# Altium footprint library PcbLib_ICs_part2.PcbLib: 66 footprints (part 5 of 5)
Each footprint in its own frame and in the unit in brackets; x right, y up, seen from the top. Pads: shape width x height; smd on the part's side, far side on the other; paste and mask are expansions set on the pad; w line width, h text height; cw(c..) or ccw(c..) is an arc to the next point about the centre after c.
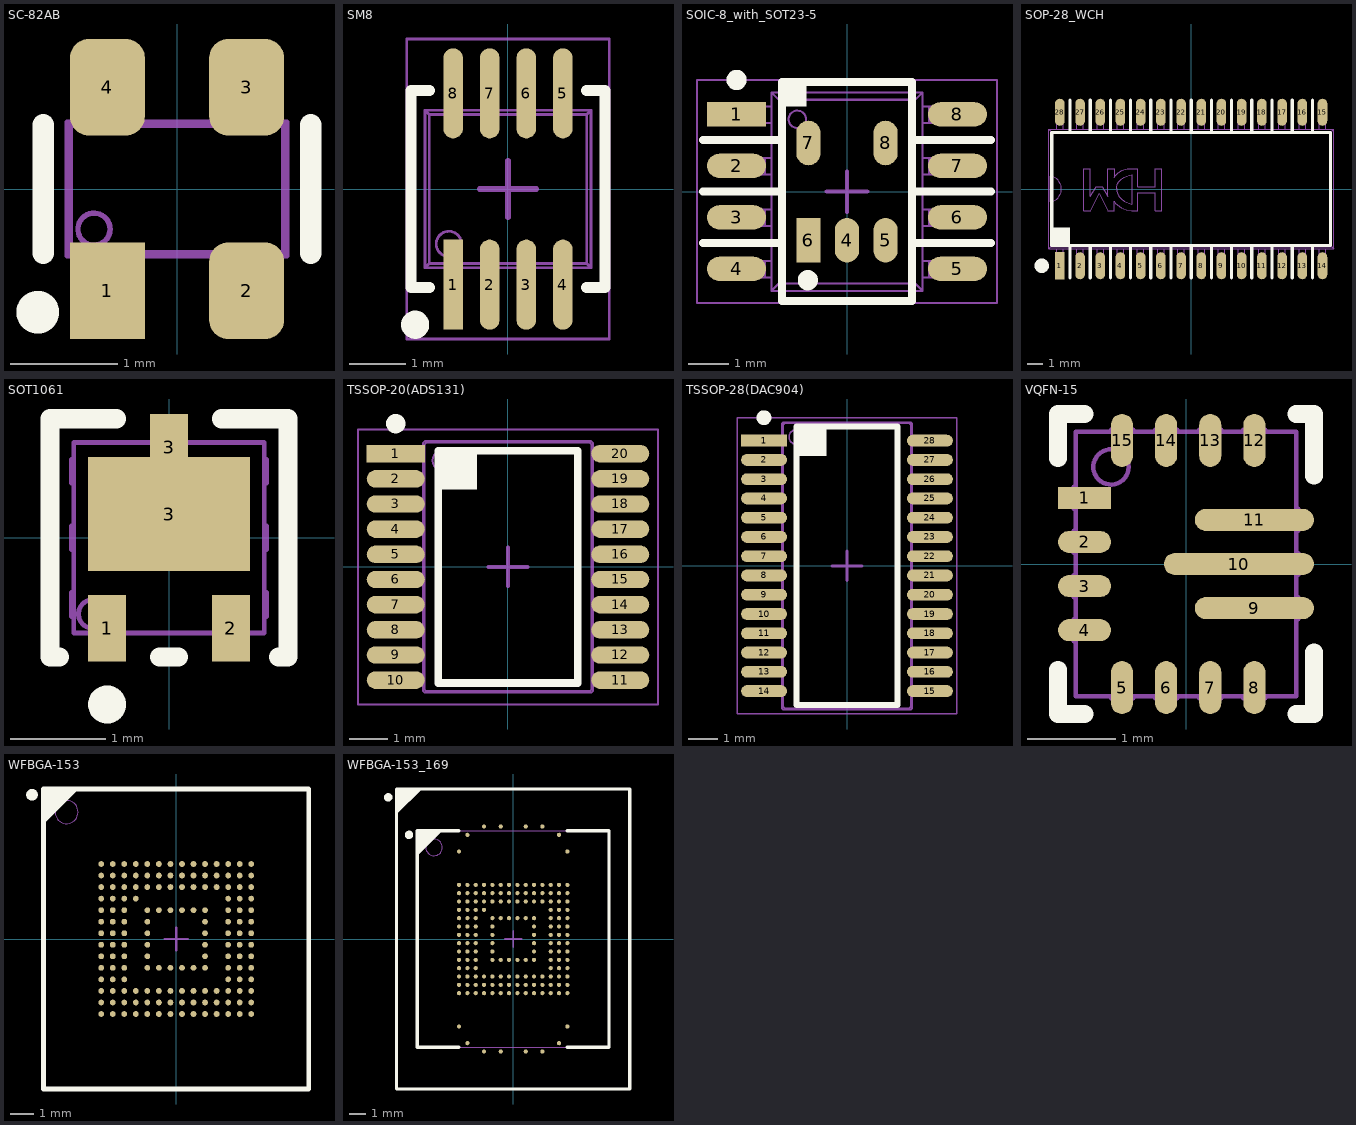
[diagram p4: the footprints below, top view; thin cyan lines are the x and y axes]

## SC-82AB [mm]
pads (4):
  rect 0.7x0.9 smd paste-0.025 mask+0.05: 1(-0.65,-0.95)
  rrect50% 0.7x0.9 smd paste-0.025 mask+0.05: 2(0.65,-0.95) 3(0.65,0.95) 4(-0.65,0.95)
Top Overlay:
  circle w0.2: c-1.3,-1.15 r0.1
  lines w0.2: -1.25,-0.6 -1.25,0.6 ; 1.25,-0.6 1.25,0.6
Top Assy:
  circle w0.05: c-0.775,-0.375 r0.15
  lines w0.05: -1.025,-0.625 -0.995,-0.595 ; -1.025,-0.625 -0.813,-0.625 ; -1.025,-0.625 -1.025,0.625 ; -1.025,0.625 -0.995,0.595 ; -1.025,0.625 -0.813,0.625 ; -0.995,-0.595 0.995,-0.595 ; -0.995,-0.595 -0.995,0.595 ; -0.995,0.595 0.995,0.595 ; -0.813,-0.961 -0.487,-0.961 ; -0.813,-0.961 -0.813,-0.893 ; -0.813,-0.961 -0.813,-1.055 -0.487,-1.055 -0.487,-0.961 ; -0.813,-0.893 -0.487,-0.893 ; -0.813,-0.893 -0.813,-0.834 ; -0.813,-0.834 -0.813,-0.686 ; -0.813,-0.834 -0.487,-0.834 ; -0.813,-0.686 -0.487,-0.686 ; -0.813,-0.686 -0.813,-0.625 ; -0.813,-0.625 -0.487,-0.625 ; -0.813,0.625 -0.813,0.686 ; -0.813,0.625 -0.487,0.625 ; -0.813,0.686 -0.813,0.834 ; -0.813,0.686 -0.487,0.686 ; -0.813,0.834 -0.487,0.834 ; -0.813,0.834 -0.813,0.893 ; -0.813,0.893 -0.487,0.893 ; -0.813,0.893 -0.813,0.961 ; -0.813,0.961 -0.487,0.961 ; -0.813,0.961 -0.813,1.055 -0.487,1.055 -0.487,0.961 ; -0.487,-0.961 -0.487,-0.893 ; -0.487,-0.893 -0.487,-0.834 ; -0.487,-0.834 -0.487,-0.686 ; -0.487,-0.686 -0.487,-0.625 ; -0.487,-0.625 0.487,-0.625 ; -0.487,0.625 -0.487,0.686 ; -0.487,0.625 0.487,0.625 ; -0.487,0.686 -0.487,0.834 ; -0.487,0.834 -0.487,0.893 ; -0.487,0.893 -0.487,0.961 ; 0.487,-0.961 0.813,-0.961 ; 0.487,-0.961 0.487,-0.893 ; 0.487,-0.961 0.487,-1.055 0.813,-1.055 0.813,-0.961 ; 0.487,-0.893 0.812,-0.893 ; 0.487,-0.893 0.487,-0.834 ; 0.487,-0.834 0.812,-0.834 ; 0.487,-0.834 0.487,-0.686 ; 0.487,-0.686 0.813,-0.686 ; 0.487,-0.686 0.487,-0.625 ; 0.487,-0.625 0.813,-0.625 ; 0.487,0.625 0.487,0.686 ; 0.487,0.625 0.813,0.625 ; 0.487,0.686 0.813,0.686 ; 0.487,0.686 0.487,0.834 ; 0.487,0.834 0.812,0.834 ; 0.487,0.834 0.487,0.893 ; 0.487,0.893 0.812,0.893 ; 0.487,0.893 0.487,0.961 ; 0.487,0.961 0.813,0.961 ; 0.487,0.961 0.487,1.055 0.813,1.055 0.813,0.961 ; 0.813,-0.961 0.812,-0.893 ; 0.812,-0.893 0.812,-0.834 ; 0.812,-0.834 0.813,-0.686 ; 0.813,-0.686 0.813,-0.625 ; 0.813,-0.625 1.025,-0.625 ; 0.813,0.625 0.813,0.686 ; 0.813,0.625 1.025,0.625 ; 0.813,0.686 0.812,0.834 ; 0.812,0.834 0.812,0.893 ; 0.812,0.893 0.813,0.961 ; 0.995,-0.595 1.025,-0.625 ; 0.995,-0.595 0.995,0.595 ; 0.995,0.595 1.025,0.625 ; 1.025,-0.625 1.025,0.625
  text ".Designator" at -1.719,-0.233 h1
3D body "SC-82AB.x_t": height 1.1, standoff 0, extent -1,-0.925 1,0.925

## SM8 [mm] "8-Leads, Body 2.8x2.95mm, Pitch 0.65mm, IPC Medium Density"
height 1.2
pads (8):
  rect 0.35x1.6 smd paste+0 mask+0.05: 1(-0.975,-1.7)
  oval 0.35x1.6 smd paste+0 mask+0.05: 2(-0.325,-1.7) 3(0.325,-1.7) 4(0.975,-1.7) 5(0.975,1.7) 6(0.325,1.7) 7(-0.325,1.7) 8(-0.975,1.7)
Top Overlay:
  circle w0.25: c-1.651,-2.413 r0.125
  lines w0.2: -1.4,-1.75 -1.725,-1.75 -1.725,1.75 -1.4,1.75 ; 1.4,-1.75 1.725,-1.75 1.725,1.75 1.4,1.75
Top Assy:
  circle w0.05: c-1.051,-0.976 r0.225
  lines w0.05: -1.475,-1.4 -1.401,-1.326 ; -1.475,-1.4 -1.475,1.4 ; -1.475,-1.4 -1.088,-1.4 ; -1.475,1.4 -1.088,1.4 ; -1.475,1.4 -1.401,1.326 ; -1.401,-1.326 -1.401,1.326 ; -1.401,-1.326 1.401,-1.326 ; -1.401,1.326 1.401,1.326 ; -1.088,-1.745 -0.863,-1.745 ; -1.088,-1.745 -1.088,-1.612 ; -1.088,-1.745 -1.088,-2 -0.863,-2 -0.863,-1.745 ; -1.088,-1.612 -0.863,-1.612 ; -1.088,-1.612 -1.088,-1.467 ; -1.088,-1.467 -0.863,-1.467 ; -1.088,-1.467 -1.088,-1.4 ; -1.088,-1.4 -0.863,-1.4 ; -1.088,1.4 -0.863,1.4 ; -1.088,1.4 -1.088,1.467 ; -1.088,1.467 -0.863,1.467 ; -1.088,1.467 -1.088,1.612 ; -1.088,1.612 -0.863,1.612 ; -1.088,1.612 -1.088,1.745 ; -1.088,1.745 -0.863,1.745 ; -1.088,1.745 -1.088,2 -0.863,2 -0.863,1.745 ; -0.863,-1.745 -0.863,-1.612 ; -0.863,-1.612 -0.863,-1.467 ; -0.863,-1.467 -0.863,-1.4 ; -0.863,-1.4 -0.437,-1.4 ; -0.863,1.4 -0.437,1.4 ; -0.863,1.4 -0.863,1.467 ; -0.863,1.467 -0.863,1.612 ; -0.863,1.612 -0.863,1.745 ; -0.437,-1.745 -0.212,-1.745 ; -0.437,-1.745 -0.437,-1.612 ; -0.437,-1.745 -0.437,-2 -0.212,-2 -0.212,-1.745 ; -0.437,-1.612 -0.212,-1.612 ; -0.437,-1.612 -0.437,-1.467 ; -0.437,-1.467 -0.212,-1.467 ; -0.437,-1.467 -0.437,-1.4 ; -0.437,-1.4 -0.212,-1.4 ; -0.437,1.4 -0.212,1.4 ; -0.437,1.4 -0.437,1.467 ; -0.437,1.467 -0.212,1.467 ; -0.437,1.467 -0.437,1.612 ; -0.437,1.612 -0.212,1.612 ; -0.437,1.612 -0.437,1.745 ; -0.437,1.745 -0.212,1.745 ; -0.437,1.745 -0.437,2 -0.212,2 -0.212,1.745 ; -0.212,-1.745 -0.212,-1.612 ; -0.212,-1.612 -0.212,-1.467 ; -0.212,-1.467 -0.212,-1.4 ; -0.212,-1.4 0.212,-1.4 ; -0.212,1.4 0.212,1.4 ; -0.212,1.4 -0.212,1.467 ; -0.212,1.467 -0.212,1.612 ; -0.212,1.612 -0.212,1.745 ; 0.212,-1.745 0.437,-1.745 ; 0.212,-1.745 0.212,-1.612 ; 0.212,-1.745 0.212,-2 0.437,-2 0.437,-1.745 ; 0.212,-1.612 0.437,-1.612 ; 0.212,-1.612 0.212,-1.467 ; 0.212,-1.467 0.437,-1.467 ; 0.212,-1.467 0.212,-1.4 ; 0.212,-1.4 0.437,-1.4 ; 0.212,1.4 0.437,1.4 ; 0.212,1.4 0.212,1.467 ; 0.212,1.467 0.437,1.467 ; 0.212,1.467 0.212,1.612 ; 0.212,1.612 0.437,1.612 ; 0.212,1.612 0.212,1.745 ; 0.212,1.745 0.437,1.745 ; 0.212,1.745 0.212,2 0.437,2 0.437,1.745 ; 0.437,-1.745 0.437,-1.612 ; 0.437,-1.612 0.437,-1.467 ; 0.437,-1.467 0.437,-1.4 ; 0.437,-1.4 0.863,-1.4 ; 0.437,1.4 0.863,1.4 ; 0.437,1.4 0.437,1.467 ; 0.437,1.467 0.437,1.612 ; 0.437,1.612 0.437,1.745 ; 0.863,-1.745 1.088,-1.745 ; 0.863,-1.745 0.863,-1.612 ; 0.863,-1.745 0.863,-2 1.088,-2 1.088,-1.745 ; 0.863,-1.612 1.088,-1.612 ; 0.863,-1.612 0.863,-1.467 ; 0.863,-1.467 1.088,-1.467 ; 0.863,-1.467 0.863,-1.4 ; 0.863,-1.4 1.088,-1.4 ; 0.863,1.4 1.088,1.4 ; 0.863,1.4 0.863,1.467 ; 0.863,1.467 1.088,1.467 ; 0.863,1.467 0.863,1.612 ; 0.863,1.612 1.088,1.612 ; 0.863,1.612 0.863,1.745 ; 0.863,1.745 1.088,1.745 ; 0.863,1.745 0.863,2 1.088,2 1.088,1.745 ; 1.088,-1.745 1.088,-1.612 ; 1.088,-1.612 1.088,-1.467 ; 1.088,-1.467 1.088,-1.4 ; 1.088,-1.4 1.475,-1.4 ; 1.088,1.4 1.475,1.4 ; 1.088,1.4 1.088,1.467 ; 1.088,1.467 1.088,1.612 ; 1.088,1.612 1.088,1.745 ; 1.401,-1.326 1.401,1.326 ; 1.401,-1.326 1.475,-1.4 ; 1.401,1.326 1.475,1.4 ; 1.475,-1.4 1.475,1.4
  text ".Designator" at -2.579,-0.349 h1.5
Top Text:
  lines w0.05: -1.8,-2.667 -1.8,2.667 1.8,2.667 1.8,-2.667 -1.8,-2.667
  lines w0.1: -0.5,0 0.5,0 ; 0,-0.5 0,0.5
3D body "SM8.x_t": height 1.3, standoff 0, extent -1.475,-2.05 1.475,1.95

## SOIC-8_with_SOT23-5 [mm] "SOIC-8 package for EEPROM"
height 1.75
pads (13):
  rect 1.45x0.6 smd paste+0 mask+0.05: 1(-2.725,1.905)
  oval 1.45x0.6 smd paste+0 mask+0.05: 2(-2.725,0.635) 3(-2.725,-0.635) 4(-2.725,-1.905) 5(2.725,-1.905) 6(2.725,-0.635) 7(2.725,0.635) 8(2.725,1.905)
  oval 0.6x1.1 smd paste+0 mask+0.05: 4(0,-1.2) 5(0.95,-1.2) 7(-0.95,1.2) 8(0.95,1.2)
  rect 0.6x1.1 smd paste+0 mask+0.05: 6(-0.95,-1.2)
Top Overlay:
  circle w0.25: c-2.725,2.755 r0.125
  circle w0.25: c-0.965,-2.184 r0.125
  region: -1,2.7 -1.6,2.7 -1.6,2.1 -1,2.1
  lines w0.2: -3.556,-1.27 -1.601,-1.27 ; -3.556,0 -1.601,0 ; -3.556,1.27 -1.601,1.27 ; 1.601,-1.27 3.556,-1.27 ; 1.601,0 3.556,0 ; 1.601,1.27 3.556,1.27 ; -1.6,-2.7 -1.6,2.7 1.6,2.7 1.6,-2.7 -1.6,-2.7
Top Assy:
  circle w0.05: c-1.225,1.784 r0.216
  lines w0.05: -2.889,-2.121 -2.502,-2.121 ; -2.889,-2.121 -2.889,-1.715 ; -2.889,-2.121 -2.889,-1.715 ; -2.889,-2.121 -1.867,-2.121 ; -2.889,-1.715 -2.502,-1.715 ; -2.889,-1.715 -1.867,-1.715 ; -2.889,-0.851 -2.502,-0.851 ; -2.889,-0.851 -2.889,-0.445 ; -2.889,-0.851 -2.889,-0.445 ; -2.889,-0.851 -1.867,-0.851 ; -2.889,-0.445 -2.502,-0.445 ; -2.889,-0.445 -1.867,-0.445 ; -2.889,0.419 -2.502,0.419 ; -2.889,0.419 -2.889,0.826 ; -2.889,0.419 -2.889,0.826 ; -2.889,0.419 -1.867,0.419 ; -2.889,0.826 -2.502,0.825 ; -2.889,0.826 -1.867,0.825 ; -2.889,1.689 -2.502,1.689 ; -2.889,1.689 -2.889,2.095 ; -2.889,1.689 -2.889,2.095 ; -2.889,1.689 -1.867,1.689 ; -2.889,2.095 -2.502,2.095 ; -2.889,2.095 -1.867,2.095 ; -2.502,-2.121 -2.502,-1.715 ; -2.502,-2.121 -2.261,-2.121 ; -2.502,-1.715 -2.261,-1.715 ; -2.502,-0.851 -2.502,-0.445 ; -2.502,-0.851 -2.261,-0.851 ; -2.502,-0.445 -2.261,-0.445 ; -2.502,0.419 -2.502,0.825 ; -2.502,0.419 -2.261,0.419 ; -2.502,0.825 -2.261,0.826 ; -2.502,1.689 -2.502,2.095 ; -2.502,1.689 -2.261,1.689 ; -2.502,2.095 -2.261,2.095 ; -2.261,-2.121 -2.261,-1.715 ; -2.261,-2.121 -2.019,-2.121 ; -2.261,-1.715 -2.019,-1.715 ; -2.261,-0.851 -2.261,-0.445 ; -2.261,-0.851 -2.019,-0.851 ; -2.261,-0.445 -2.019,-0.445 ; -2.261,0.419 -2.261,0.826 ; -2.261,0.419 -2.019,0.419 ; -2.261,0.826 -2.019,0.825 ; -2.261,1.689 -2.261,2.095 ; -2.261,1.689 -2.019,1.689 ; -2.261,2.095 -2.019,2.095 ; -2.019,-2.121 -2.019,-1.715 ; -2.019,-2.121 -1.867,-2.121 ; -2.019,-1.715 -1.867,-1.715 ; -2.019,-0.851 -2.019,-0.445 ; -2.019,-0.851 -1.867,-0.851 ; -2.019,-0.445 -1.867,-0.445 ; -2.019,0.419 -2.019,0.825 ; -2.019,0.419 -1.867,0.419 ; -2.019,0.825 -1.867,0.825 ; -2.019,1.689 -2.019,2.095 ; -2.019,1.689 -1.867,1.689 ; -2.019,2.095 -1.867,2.095 ; -1.867,-2.451 1.867,-2.451 ; -1.867,-2.451 -1.682,-2.266 ; -1.867,-2.451 -1.867,2.451 ; -1.867,-2.451 -1.867,-2.121 ; -1.867,-2.451 1.867,-2.451 ; -1.867,-1.715 -1.867,-0.851 ; -1.867,-0.445 -1.867,0.419 ; -1.867,0.825 -1.867,1.689 ; -1.867,2.095 -1.867,2.451 ; -1.867,2.451 1.867,2.451 ; -1.867,2.451 -1.682,2.266 ; -1.867,2.451 1.867,2.451 ; -1.682,-2.266 1.682,-2.266 ; -1.682,-2.266 -1.682,2.266 ; -1.682,2.266 1.682,2.266 ; 1.682,-2.266 1.867,-2.451 ; 1.682,-2.266 1.682,2.266 ; 1.682,2.266 1.867,2.451 ; 1.867,-2.451 1.867,2.451 ; 1.867,-2.451 1.867,-2.121 ; 1.867,-2.121 2.019,-2.121 ; 1.867,-2.121 2.889,-2.121 ; 1.867,-1.715 2.019,-1.715 ; 1.867,-1.715 2.889,-1.715 ; 1.867,-1.715 1.867,-0.851 ; 1.867,-0.851 2.019,-0.851 ; 1.867,-0.851 2.889,-0.851 ; 1.867,-0.445 2.019,-0.445 ; 1.867,-0.445 2.889,-0.445 ; 1.867,-0.445 1.867,0.419 ; 1.867,0.419 2.019,0.419 ; 1.867,0.419 2.889,0.419 ; 1.867,0.825 2.019,0.826 ; 1.867,0.825 2.889,0.825 ; 1.867,0.825 1.867,1.689 ; 1.867,1.689 2.019,1.689 ; 1.867,1.689 2.889,1.689 ; 1.867,2.095 2.019,2.095 ; 1.867,2.095 2.889,2.095 ; 1.867,2.095 1.867,2.451 ; 2.019,-2.121 2.019,-1.715 ; 2.019,-2.121 2.261,-2.121 ; 2.019,-1.715 2.261,-1.715 ; 2.019,-0.851 2.019,-0.445 ; 2.019,-0.851 2.261,-0.851 ; 2.019,-0.445 2.261,-0.445 ; 2.019,0.419 2.019,0.826 ; 2.019,0.419 2.261,0.419 ; 2.019,0.826 2.261,0.826 ; 2.019,1.689 2.019,2.095 ; 2.019,1.689 2.261,1.689 ; 2.019,2.095 2.261,2.095 ; 2.261,-2.121 2.502,-2.121 ; 2.261,-2.121 2.261,-1.715 ; 2.261,-1.715 2.502,-1.715 ; 2.261,-0.851 2.502,-0.851 ; 2.261,-0.851 2.261,-0.445 ; 2.261,-0.445 2.502,-0.445 ; 2.261,0.419 2.502,0.419 ; 2.261,0.419 2.261,0.826 ; 2.261,0.826 2.502,0.825 ; 2.261,1.689 2.502,1.689 ; 2.261,1.689 2.261,2.095 ; 2.261,2.095 2.502,2.095 ; 2.502,-2.121 2.502,-1.715 ; 2.502,-2.121 2.889,-2.121 ; 2.502,-1.715 2.889,-1.715 ; 2.502,-0.851 2.502,-0.445 ; 2.502,-0.851 2.889,-0.851 ; 2.502,-0.445 2.889,-0.445 ; 2.502,0.419 2.502,0.825 ; 2.502,0.419 2.889,0.419 ; 2.502,0.825 2.889,0.825 ; 2.502,1.689 2.502,2.095 ; 2.502,1.689 2.889,1.689 ; 2.502,2.095 2.889,2.095 ; 2.889,-2.121 2.889,-1.715 ; 2.889,-2.121 2.889,-1.715 ; 2.889,-0.851 2.889,-0.445 ; 2.889,-0.851 2.889,-0.445 ; 2.889,0.419 2.889,0.825 ; 2.889,0.419 2.889,0.825 ; 2.889,1.689 2.889,2.095 ; 2.889,1.689 2.889,2.095
  text ".Designator" at 0.467,-3.443 h2
Top Text:
  lines w0.05: -3.7,-2.75 3.7,-2.75 3.7,2.75 -3.7,2.75 -3.7,-2.75
  lines w0.1: -0.5,0 0.5,0 ; 0,-0.5 0,0.5
3D body "User Library-SOIC-8-1.step": height 1.75, standoff 0, extent -3,-2.45 3,2.45

## SOP-28_WCH [mm] "SOP-28, 300 mil"
pads (28):
  rect 0.6x1.7 smd paste+0 mask+0.05: 1(-8.255,-4.826)
  oval 0.6x1.7 smd paste+0 mask+0.05: 2(-6.985,-4.826) 3(-5.715,-4.826) 4(-4.445,-4.826) 5(-3.175,-4.826) 6(-1.905,-4.826) 7(-0.635,-4.826) 8(0.635,-4.826) 9(1.905,-4.826) 10(3.175,-4.826) 11(4.445,-4.826) 12(5.715,-4.826) 13(6.985,-4.826) 14(8.255,-4.826) 15(8.255,4.826) 16(6.985,4.826) 17(5.715,4.826) 18(4.445,4.826) 19(3.175,4.826) 20(1.905,4.826) 21(0.635,4.826) 22(-0.635,4.826) 23(-1.905,4.826) 24(-3.175,4.826) 25(-4.445,4.826) 26(-5.715,4.826) 27(-6.985,4.826) 28(-8.255,4.826)
Top Overlay:
  circle w0.5: c-9.398,-4.826 r0.2
  rectangle: -8.763,-3.556 -7.62,-2.413
  lines w0.2: -7.62,-5.588 -7.62,-3.556 ; -7.62,3.556 -7.62,5.588 ; -6.35,-5.588 -6.35,-3.556 ; -6.35,3.556 -6.35,5.588 ; -5.08,-5.588 -5.08,-3.556 ; -5.08,3.556 -5.08,5.588 ; -3.81,-5.588 -3.81,-3.556 ; -3.81,3.556 -3.81,5.588 ; -2.54,-5.588 -2.54,-3.556 ; -2.54,3.556 -2.54,5.588 ; -1.27,-5.588 -1.27,-3.556 ; -1.27,3.556 -1.27,5.588 ; 0,-5.588 0,-3.556 ; 0,3.556 0,5.588 ; 1.27,-5.588 1.27,-3.556 ; 1.27,3.556 1.27,5.588 ; 2.54,-5.588 2.54,-3.556 ; 2.54,3.556 2.54,5.588 ; 3.81,-5.588 3.81,-3.556 ; 3.81,3.556 3.81,5.588 ; 5.08,-5.588 5.08,-3.556 ; 5.08,3.556 5.08,5.588 ; 6.35,-5.588 6.35,-3.556 ; 6.35,3.556 6.35,5.588 ; 7.62,-5.588 7.62,-3.556 ; 7.62,3.556 7.62,5.588 ; -8.763,-3.556 8.763,-3.556 8.763,3.556 -8.763,3.556 -8.763,-3.556
Top Assy:
  drawing of 548 lines, arcs and shapes, not listed
  text ".Designator" at -1.162,-0.7 h3
3D body "SOP-28_WCH.x_t": height 2.54, standoff 0, extent -8.955,-5.155 8.955,5.155

## SOT1061 [mm] "SOT1061"
pads (4):
  rect 0.4x0.7 smd paste-0.05 mask+0.05: 1(-0.65,-0.95) 2(0.65,-0.95) 3(0,0.95)
  rect 1.7x1.2 smd paste-3 mask+0.05: 3(0,0.25)
Top Overlay:
  circle w0.2: c-0.65,-1.75 r0.1
  lines w0.2: -1.15,-1.25 -1.25,-1.25 -1.25,1.25 -0.55,1.25 ; -0.1,-1.25 0.1,-1.25 ; 0.55,1.25 1.25,1.25 1.25,-1.25 1.15,-1.25
Top Paste:
  region: 0.8,0.45 0.2,0.45 0.2,-0.15 0.8,-0.15
  region: -0.2,0.45 -0.8,0.45 -0.8,-0.15 -0.2,-0.15
Top Assy:
  circle w0.05: c-0.8,-0.8 r0.15
  lines w0.05: -1,-0.825 -1.025,-0.825 -1.025,-0.575 -1,-0.575 ; -1,-0.125 -1.025,-0.125 -1.025,0.125 -1,0.125 ; -1,0.575 -1.025,0.575 -1.025,0.825 -1,0.825 ; -0.8,-1 -0.8,-1.025 -0.5,-1.025 -0.5,-1 ; -0.15,1 -0.15,1.025 0.15,1.025 0.15,1 ; 0.5,-1 0.5,-1.025 0.8,-1.025 0.8,-1 ; 1,-0.825 1.025,-0.825 1.025,-0.575 1,-0.575 ; 1,-0.125 1.025,-0.125 1.025,0.125 1,0.125 ; 1,0.575 1.025,0.575 1.025,0.825 1,0.825 ; -1,-1 -1,1 1,1 1,-1 -1,-1
  text ".Designator" at -2.149,-0.291 h1.25
3D body "SOT1061.STEP": height 0.7, standoff 0, extent -1.025,-1.025 1.025,1.025

## TSSOP-20(ADS131) [mm] "TSOP, 20-Leads, Body 6.50x4.40mm, Pitch 0.65mm, IPC Medium Density"
height 1.1
pads (20):
  rect 1.5x0.45 smd paste+0 mask+0.05: 1(-2.9,2.925)
  oval 1.5x0.45 smd paste+0 mask+0.05: 2(-2.9,2.275) 3(-2.9,1.625) 4(-2.9,0.975) 5(-2.9,0.325) 6(-2.9,-0.325) 7(-2.9,-0.975) 8(-2.9,-1.625) 9(-2.9,-2.275) 10(-2.9,-2.925) 11(2.9,-2.925) 12(2.9,-2.275) 13(2.9,-1.625) 14(2.9,-0.975) 15(2.9,-0.325) 16(2.9,0.325) 17(2.9,0.975) 18(2.9,1.625) 19(2.9,2.275) 20(2.9,2.925)
Top Overlay:
  circle w0.25: c-2.9,3.7 r0.125
  region: -1.8,3 -1.8,2 -0.8,2 -0.8,3
  lines w0.2: -1.8,-3 -1.8,3 1.8,3 1.8,-3 -1.8,-3
Top Assy:
  drawing of 333 lines, arcs and shapes, not listed
  text ".Designator" at 0.349,-2.579 h1.5
Top Text:
  lines w0.05: -3.875,-3.55 3.875,-3.55 3.875,3.55 -3.875,3.55 -3.875,-3.55
  lines w0.1: -0.5,0 0.5,0 ; 0,-0.5 0,0.5
3D body "TSSOP20_ADS131.x_t": height 1.2, standoff 0, extent -3.2,-3.25 3.2,3.25

## TSSOP-28(DAC904) [mm] "TSOP, 28-Leads, Pitch 0.65mm, IPC Medium Density"
height 1.1
pads (28):
  rect 1.55x0.4 smd paste+0 mask+0.05: 1(-2.8,4.225)
  oval 1.55x0.4 smd paste+0 mask+0.05: 2(-2.8,3.575) 3(-2.8,2.925) 4(-2.8,2.275) 5(-2.8,1.625) 6(-2.8,0.975) 7(-2.8,0.325) 8(-2.8,-0.325) 9(-2.8,-0.975) 10(-2.8,-1.625) 11(-2.8,-2.275) 12(-2.8,-2.925) 13(-2.8,-3.575) 14(-2.8,-4.225) 15(2.8,-4.225) 16(2.8,-3.575) 17(2.8,-2.925) 18(2.8,-2.275) 19(2.8,-1.625) 20(2.8,-0.975) 21(2.8,-0.325) 22(2.8,0.325) 23(2.8,0.975) 24(2.8,1.625) 25(2.8,2.275) 26(2.8,2.925) 27(2.8,3.575) 28(2.8,4.225)
Top Overlay:
  circle w0.25: c-2.8,5 r0.125
  region: -1.7,4.7 -1.7,3.7 -0.7,3.7 -0.7,4.7
  lines w0.2: -1.7,-4.7 -1.7,4.7 1.7,4.7 1.7,-4.7 -1.7,-4.7
Top Assy:
  drawing of 453 lines, arcs and shapes, not listed
  text ".Designator" at 0.467,-3.443 h2
Top Text:
  lines w0.05: -3.7,-5 -3.7,5 3.7,5 3.7,-5 -3.7,-5
  lines w0.1: -0.5,0 0.5,0 ; 0,-0.5 0,0.5
3D body "TSSOP28_DAC904.x_t": height 1.2, standoff 0, extent -3.2,-4.85 3.2,4.85

## VQFN-15 [mm] "Power VQFN 3mm x 2.5mm"
pads (15):
  rect 0.6x0.25 smd paste-0.025 mask+0.05: 1(-1.15,0.75)
  oval 0.6x0.25 smd paste-0.025 mask+0.05: 2(-1.15,0.25) 3(-1.15,-0.25) 4(-1.15,-0.75)
  oval 0.25x0.6 smd paste-0.025 mask+0.05: 5(-0.725,-1.4) 6(-0.225,-1.4) 7(0.275,-1.4) 8(0.775,-1.4) 12(0.775,1.4) 13(0.275,1.4) 14(-0.225,1.4) 15(-0.725,1.4)
  oval 1.35x0.25 smd paste-0.025 mask+0.05: 9(0.775,-0.5) 11(0.775,0.5)
  oval 1.7x0.25 smd paste-0.025 mask+0.05: 10(0.6,0)
Top Overlay:
  lines w0.2: -1.45,-1.2 -1.45,-1.7 -1.15,-1.7 ; -1.45,1.2 -1.45,1.7 -1.15,1.7 ; 1.25,-1.7 1.45,-1.7 1.45,-1 ; 1.25,1.7 1.45,1.7 1.45,1
Top Solder:
  rectangle: 0.28,1.05 0.78,1.4
  rectangle: 0.28,-1.4 0.78,-1.05
Top Assy:
  circle w0.05: c-0.85,1.1 r0.2
  lines w0.05: -1.25,-0.875 -1.27,-0.875 -1.27,-0.625 -1.25,-0.625 ; -1.25,-0.375 -1.27,-0.375 -1.27,-0.125 -1.25,-0.125 ; -1.25,0.125 -1.27,0.125 -1.27,0.375 -1.25,0.375 ; -1.25,0.625 -1.27,0.625 -1.27,0.875 -1.25,0.875 ; -0.85,-1.5 -0.85,-1.52 -0.6,-1.52 -0.6,-1.5 ; -0.85,1.5 -0.85,1.52 -0.6,1.52 -0.6,1.5 ; -0.35,-1.5 -0.35,-1.52 -0.1,-1.52 -0.1,-1.5 ; -0.35,1.5 -0.35,1.52 -0.1,1.52 -0.1,1.5 ; 0.15,-1.5 0.15,-1.52 0.4,-1.52 0.4,-1.5 ; 0.15,1.5 0.15,1.52 0.4,1.52 0.4,1.5 ; 0.65,-1.5 0.65,-1.52 0.9,-1.52 0.9,-1.5 ; 0.65,1.5 0.65,1.52 0.9,1.52 0.9,1.5 ; 1.25,-0.625 1.27,-0.625 1.27,-0.375 1.25,-0.375 ; 1.25,-0.125 1.27,-0.125 1.27,0.125 1.25,0.125 ; 1.25,0.375 1.27,0.375 1.27,0.625 1.25,0.625 ; -1.25,-1.5 1.25,-1.5 1.25,1.5 -1.25,1.5 -1.25,-1.5
  text ".Designator" at -3.443,-0.467 h2
3D body "VQFN15_RNM0015A.x_t": height 1, standoff 0, extent -1.27,-1.52 1.27,1.52

## WFBGA-153 [mm] "WFBGA-153, 153-Leads, Body 11.50x13.00mm, Pitch 0.50mm"
height 3.5
pads (153):
  round 0.25 smd mask+0.05: A1(-3.25,3.25) A2(-2.75,3.25) A3(-2.25,3.25) A4(-1.75,3.25) A5(-1.25,3.25) A6(-0.75,3.25) A7(-0.25,3.25) A8(0.25,3.25) A9(0.75,3.25) A10(1.25,3.25) A11(1.75,3.25) A12(2.25,3.25) A13(2.75,3.25) A14(3.25,3.25) B1(-3.25,2.75) B2(-2.75,2.75) B3(-2.25,2.75) B4(-1.75,2.75) B5(-1.25,2.75) B6(-0.75,2.75) B7(-0.25,2.75) B8(0.25,2.75) B9(0.75,2.75) B10(1.25,2.75) B11(1.75,2.75) B12(2.25,2.75) B13(2.75,2.75) B14(3.25,2.75) C1(-3.25,2.25) C2(-2.75,2.25) C3(-2.25,2.25) C4(-1.75,2.25) C5(-1.25,2.25) C6(-0.75,2.25) C7(-0.25,2.25) C8(0.25,2.25) C9(0.75,2.25) C10(1.25,2.25) C11(1.75,2.25) C12(2.25,2.25) C13(2.75,2.25) C14(3.25,2.25) D1(-3.25,1.75) D2(-2.75,1.75) D3(-2.25,1.75) D4(-1.75,1.75) D12(2.25,1.75) D13(2.75,1.75) D14(3.25,1.75) E1(-3.25,1.25) E2(-2.75,1.25) E3(-2.25,1.25) E5(-1.25,1.25) E6(-0.75,1.25) E7(-0.25,1.25) E8(0.25,1.25) E9(0.75,1.25) E10(1.25,1.25) E12(2.25,1.25) E13(2.75,1.25) E14(3.25,1.25) F1(-3.25,0.75) F2(-2.75,0.75) F3(-2.25,0.75) F5(-1.25,0.75) F10(1.25,0.75) F12(2.25,0.75) F13(2.75,0.75) F14(3.25,0.75) G1(-3.25,0.25) G2(-2.75,0.25) G3(-2.25,0.25) G5(-1.25,0.25) G10(1.25,0.25) G12(2.25,0.25) G13(2.75,0.25) G14(3.25,0.25) H1(-3.25,-0.25) H2(-2.75,-0.25) H3(-2.25,-0.25) H5(-1.25,-0.25) H10(1.25,-0.25) H12(2.25,-0.25) H13(2.75,-0.25) H14(3.25,-0.25) J1(-3.25,-0.75) J2(-2.75,-0.75) J3(-2.25,-0.75) J5(-1.25,-0.75) J10(1.25,-0.75) J12(2.25,-0.75) J13(2.75,-0.75) J14(3.25,-0.75) K1(-3.25,-1.25) K2(-2.75,-1.25) K3(-2.25,-1.25) K5(-1.25,-1.25) K6(-0.75,-1.25) K7(-0.25,-1.25) K8(0.25,-1.25) K9(0.75,-1.25) K10(1.25,-1.25) K12(2.25,-1.25) K13(2.75,-1.25) K14(3.25,-1.25) L1(-3.25,-1.75) L2(-2.75,-1.75) L3(-2.25,-1.75) L12(2.25,-1.75) L13(2.75,-1.75) L14(3.25,-1.75) M1(-3.25,-2.25) M2(-2.75,-2.25) M3(-2.25,-2.25) M4(-1.75,-2.25) M5(-1.25,-2.25) M6(-0.75,-2.25) M7(-0.25,-2.25) M8(0.25,-2.25) M9(0.75,-2.25) M10(1.25,-2.25) M11(1.75,-2.25) M12(2.25,-2.25) M13(2.75,-2.25) M14(3.25,-2.25) N1(-3.25,-2.75) N2(-2.75,-2.75) N3(-2.25,-2.75) N4(-1.75,-2.75) N5(-1.25,-2.75) N6(-0.75,-2.75) N7(-0.25,-2.75) N8(0.25,-2.75) N9(0.75,-2.75) N10(1.25,-2.75) N11(1.75,-2.75) N12(2.25,-2.75) N13(2.75,-2.75) N14(3.25,-2.75) P1(-3.25,-3.25) P2(-2.75,-3.25) P3(-2.25,-3.25) P4(-1.75,-3.25) P5(-1.25,-3.25) P6(-0.75,-3.25) P7(-0.25,-3.25) P8(0.25,-3.25) P9(0.75,-3.25) P10(1.25,-3.25) P11(1.75,-3.25) P12(2.25,-3.25) P13(2.75,-3.25) P14(3.25,-3.25)
Top Overlay:
  circle w0.25: c-6.25,6.25 r0.125
  region: -5.75,6.5 -5.75,5 -4.25,6.5
  lines w0.2: -5.75,-6.5 5.75,-6.5 5.75,6.5 -5.75,6.5 -5.75,-6.5
Top Assy:
  circle w0.05: c-4.75,5.5 r0.5
  lines w0.05: -5.75,-6.5 -5.75,6.5 5.75,6.5 5.75,-6.5 -5.75,-6.5
  text ".Designator" at -2.579,-0.349 h1.5
Top Text:
  lines w0.1: -0.5,0 0.5,0 ; 0,-0.5 0,0.5
3D body "WFBGA-153.STEP": height 0.8, standoff 0, extent -5.75,-6.5 5.75,6.5

## WFBGA-153_169 [mm] "WFBGA-153, 153-Leads, Body 11.50x13.00mm, Pitch 0.50mm"
height 3.5
pads (169):
  round 0.25 smd mask+0.05: 169_A4(-1.75,6.75) 169_A6(-0.75,6.75) 169_A9(0.75,6.75) 169_A11(1.75,6.75) 169_AE1(-3.25,-5.25) 169_AE14(3.25,-5.25) 169_AG2(-2.75,-6.25) 169_AG13(2.75,-6.25) 169_AH4(-1.75,-6.75) 169_AH6(-0.75,-6.75) 169_AH9(0.75,-6.75) 169_AH11(1.75,-6.75) 169_B2(-2.75,6.25) 169_B13(2.75,6.25) 169_D1(-3.25,5.25) 169_D14(3.25,5.25) A1(-3.25,3.25) A2(-2.75,3.25) A3(-2.25,3.25) A4(-1.75,3.25) A5(-1.25,3.25) A6(-0.75,3.25) A7(-0.25,3.25) A8(0.25,3.25) A9(0.75,3.25) A10(1.25,3.25) A11(1.75,3.25) A12(2.25,3.25) A13(2.75,3.25) A14(3.25,3.25) B1(-3.25,2.75) B2(-2.75,2.75) B3(-2.25,2.75) B4(-1.75,2.75) B5(-1.25,2.75) B6(-0.75,2.75) B7(-0.25,2.75) B8(0.25,2.75) B9(0.75,2.75) B10(1.25,2.75) B11(1.75,2.75) B12(2.25,2.75) B13(2.75,2.75) B14(3.25,2.75) C1(-3.25,2.25) C2(-2.75,2.25) C3(-2.25,2.25) C4(-1.75,2.25) C5(-1.25,2.25) C6(-0.75,2.25) C7(-0.25,2.25) C8(0.25,2.25) C9(0.75,2.25) C10(1.25,2.25) C11(1.75,2.25) C12(2.25,2.25) C13(2.75,2.25) C14(3.25,2.25) D1(-3.25,1.75) D2(-2.75,1.75) D3(-2.25,1.75) D4(-1.75,1.75) D12(2.25,1.75) D13(2.75,1.75) D14(3.25,1.75) E1(-3.25,1.25) E2(-2.75,1.25) E3(-2.25,1.25) E5(-1.25,1.25) E6(-0.75,1.25) E7(-0.25,1.25) E8(0.25,1.25) E9(0.75,1.25) E10(1.25,1.25) E12(2.25,1.25) E13(2.75,1.25) E14(3.25,1.25) F1(-3.25,0.75) F2(-2.75,0.75) F3(-2.25,0.75) F5(-1.25,0.75) F10(1.25,0.75) F12(2.25,0.75) F13(2.75,0.75) F14(3.25,0.75) G1(-3.25,0.25) G2(-2.75,0.25) G3(-2.25,0.25) G5(-1.25,0.25) G10(1.25,0.25) G12(2.25,0.25) G13(2.75,0.25) G14(3.25,0.25) H1(-3.25,-0.25) H2(-2.75,-0.25) H3(-2.25,-0.25) H5(-1.25,-0.25) H10(1.25,-0.25) H12(2.25,-0.25) H13(2.75,-0.25) H14(3.25,-0.25) J1(-3.25,-0.75) J2(-2.75,-0.75) J3(-2.25,-0.75) J5(-1.25,-0.75) J10(1.25,-0.75) J12(2.25,-0.75) J13(2.75,-0.75) J14(3.25,-0.75) K1(-3.25,-1.25) K2(-2.75,-1.25) K3(-2.25,-1.25) K5(-1.25,-1.25) K6(-0.75,-1.25) K7(-0.25,-1.25) K8(0.25,-1.25) K9(0.75,-1.25) K10(1.25,-1.25) K12(2.25,-1.25) K13(2.75,-1.25) K14(3.25,-1.25) L1(-3.25,-1.75) L2(-2.75,-1.75) L3(-2.25,-1.75) L12(2.25,-1.75) L13(2.75,-1.75) L14(3.25,-1.75) M1(-3.25,-2.25) M2(-2.75,-2.25) M3(-2.25,-2.25) M4(-1.75,-2.25) M5(-1.25,-2.25) M6(-0.75,-2.25) M7(-0.25,-2.25) M8(0.25,-2.25) M9(0.75,-2.25) M10(1.25,-2.25) M11(1.75,-2.25) M12(2.25,-2.25) M13(2.75,-2.25) M14(3.25,-2.25) N1(-3.25,-2.75) N2(-2.75,-2.75) N3(-2.25,-2.75) N4(-1.75,-2.75) N5(-1.25,-2.75) N6(-0.75,-2.75) N7(-0.25,-2.75) N8(0.25,-2.75) N9(0.75,-2.75) N10(1.25,-2.75) N11(1.75,-2.75) N12(2.25,-2.75) N13(2.75,-2.75) N14(3.25,-2.75) P1(-3.25,-3.25) P2(-2.75,-3.25) P3(-2.25,-3.25) P4(-1.75,-3.25) P5(-1.25,-3.25) P6(-0.75,-3.25) P7(-0.25,-3.25) P8(0.25,-3.25) P9(0.75,-3.25) P10(1.25,-3.25) P11(1.75,-3.25) P12(2.25,-3.25) P13(2.75,-3.25) P14(3.25,-3.25)
Top Overlay:
  circle w0.25: c-7.5,8.5 r0.125
  circle w0.25: c-6.25,6.25 r0.125
  region: -5.75,6.5 -5.75,5 -4.25,6.5
  region: -7,9 -7,7.5 -5.5,9
  lines w0.2: -3.25,-6.5 -5.75,-6.5 -5.75,6.5 -3.25,6.5 ; 3.25,-6.5 5.75,-6.5 5.75,6.5 3.25,6.5 ; -7,-9 7,-9 7,9 -7,9 -7,-9
Top Assy:
  circle w0.05: c-4.75,5.5 r0.5
  lines w0.05: -5.75,-6.5 -5.75,6.5 5.75,6.5 5.75,-6.5 -5.75,-6.5
  text ".Designator" at -2.579,-0.349 h1.5
Top Text:
  lines w0.1: -0.5,0 0.5,0 ; 0,-0.5 0,0.5
3D body "WFBGA-153.STEP": height 0.8, standoff 0, extent -5.75,-6.5 5.75,6.5